# Altium footprint library Misc.PcbLib: 159 footprints (part 4 of 10)
Each footprint in its own frame and in the unit in brackets; x right, y up, seen from the top. Pads: shape width x height; smd on the part's side, far side on the other; paste and mask are expansions set on the pad; w line width, h text height; cw(c..) or ccw(c..) is an arc to the next point about the centre after c.
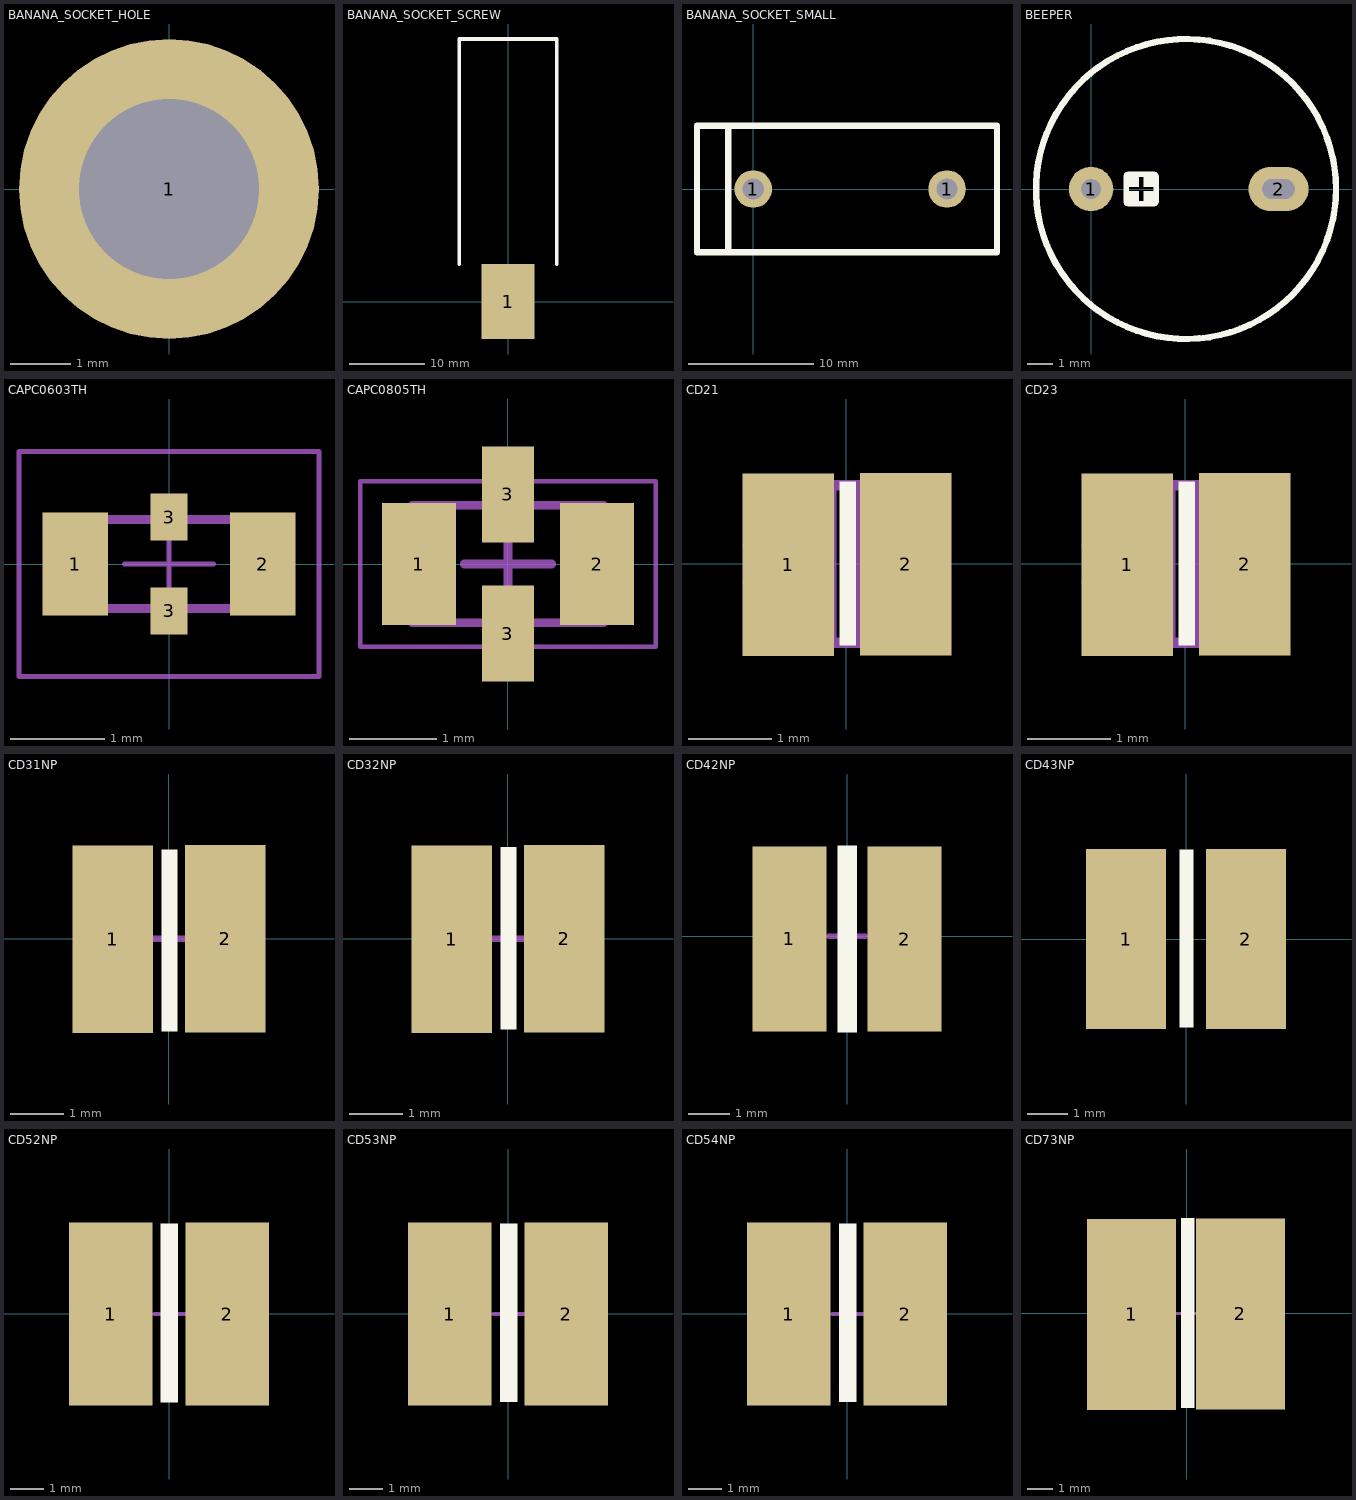
[diagram p3: the footprints below, top view; thin cyan lines are the x and y axes]

## BANANA_SOCKET_HOLE [mm]
pads (1):
  round 5 hole 3: 1(0,0)

## BANANA_SOCKET_SCREW [mm]
height 18
pads (1):
  rect 7x10 smd: 1(0,0)
Top Overlay:
  lines w0.5: -6.5,5 -6.5,35 6.5,35 6.5,5

## BANANA_SOCKET_SMALL [mm]
height 13
pads (2):
  round 3 hole 1.7: 1(0,0) 1(15.5,0)
Top Overlay:
  lines w0.508: -2,-5.05 -2,5.05 ; -4.5,-5.05 19.5,-5.05 19.5,5.05 -4.5,5.05 -4.5,-5.05
3D body: height 13, standoff 3, extent -4.5,-5 -2,5
3D body: height 13, standoff 0, extent -2,-5.05 19.5,5.05

## BEEPER [mm]
pads (2):
  round 1.778 hole 0.8: 1(0,0)
  oval 2.4x1.778 hole 0.8 slot 1.3 at 0 deg: 2(7.5,0)
Top Overlay:
  circle w0.254: c3.799,0 r6.001
  region: 1.5,0.7 1.46,0.7 1.387,0.67 1.33,0.613 1.3,0.54 1.3,0.5 1.3,-0.1 1.5,-0.1 1.5,0.1 1.9,0.1 1.9,0.5 2.1,0.5 2.1,0.1 2.5,0.1 2.5,-0.1 2.1,-0.1 2.1,-0.5 1.9,-0.5 1.9,-0.1 1.3,-0.1 1.3,-0.5 1.3,-0.54 1.33,-0.613 1.387,-0.67 1.46,-0.7 1.5,-0.7 2.5,-0.7 2.54,-0.7 2.613,-0.67 2.67,-0.613 2.7,-0.54 2.7,-0.5 2.7,0.5 2.7,0.54 2.67,0.613 2.613,0.67 2.54,0.7 2.5,0.7
3D body "User Library-WST-1203UX.STEP": height 9.65, standoff -4.5, extent -5.727,-6 9.727,6

## CAPC0603TH [mm] "Chip Capacitor, Body 1.6x0.8mm, Height 0.55mm, IPC Low Density"
height 0.55
pads (4):
  rect 0.7x1.1 smd: 1(-1,0) 2(1,0)
  rect 0.4x0.5 smd: 3(0,-0.5) 3(0,0.5)
Mechanical 13:
  lines w0.1: -0.875,-0.475 -0.875,0.475 0.875,0.475 0.875,-0.475 -0.875,-0.475
Mechanical 15:
  lines w0.05: -0.475,0 0.475,0 ; 0,-0.475 0,0.475 ; -1.6,-1.2 -1.6,1.2 1.6,1.2 1.6,-1.2 -1.6,-1.2
3D body: height 0.55, standoff 0, extent -0.525,-0.475 0.525,0.475
3D body: height 0.55, standoff 0, extent -0.875,-0.475 -0.525,0.475
3D body: height 0.55, standoff 0, extent 0.525,-0.475 0.875,0.475

## CAPC0805TH [mm] "Chip Capacitor, 2-Leads, Body 2.00x1.25mm, IPC Medium Density"
height 0.95
pads (4):
  rect 0.85x1.4 smd: 1(-1.025,0) 2(1.025,0)
  rect 0.6x1.1 smd: 3(0,-0.8) 3(0,0.8)
Assembly Top:
  lines w0.1: -1.1,-0.675 1.1,-0.675 1.1,0.675 -1.1,0.675 -1.1,-0.675
Courtyard Top:
  lines w0.05: -1.7,-0.95 1.7,-0.95 1.7,0.95 -1.7,0.95 -1.7,-0.95
  lines w0.1: -0.5,0 0.5,0 ; 0,-0.5 0,0.5
3D body: height 0.95, standoff 0, extent 0.9,-0.675 1.1,0.675
3D body: height 0.95, standoff 0, extent -1.1,-0.675 -0.9,0.675
3D body: height 0.95, standoff 0, extent -0.9,-0.675 0.9,0.675

## CD21 [mm] "CD23"
pads (2):
  rect 1.1x2.2 smd: 1(-0.702,-0.011) 2(0.716,-0.002)
Top Overlay:
  rectangle: -0.083,-0.985 0.118,0.997
Mechanical 2:
  lines w0.127: -0.181,-0.943 -0.181,0.935 ; 0.16,-0.947 0.16,0.94 ; -1.19,-0.22 ccw(c-0.01,-0.001) -0.744,-0.951 0.723,-0.951 ccw(c-0.01,-0.001) 1.169,-0.221 cw(c1.428,-0.001) 1.169,0.22 ccw(c-0.01,-0.001) 0.723,0.949 -0.744,0.949 ccw(c-0.01,-0.001) -1.19,0.219 cw(c-1.447,-0.001) -1.19,-0.22
3D body "CD21.STEP": height 1.6, standoff -0.05, extent -1.208,-1.024 1.259,0.976

## CD23 [mm] "CD23"
pads (2):
  rect 1.1x2.2 smd: 1(-0.702,-0.011) 2(0.716,-0.002)
Top Overlay:
  rectangle: -0.083,-0.985 0.118,0.997
Mechanical 2:
  lines w0.127: -0.181,-0.943 -0.181,0.935 ; 0.16,-0.947 0.16,0.94 ; -1.19,-0.22 ccw(c-1.447,-0.001) -1.19,0.219 cw(c-0.01,-0.001) -0.744,0.949 0.723,0.949 cw(c-0.01,-0.001) 1.169,0.22 ccw(c1.428,-0.001) 1.169,-0.221 cw(c-0.01,-0.001) 0.723,-0.951 -0.744,-0.951 cw(c-0.01,-0.001) -1.19,-0.22
3D body "CD23.STEP": height 2, standoff -0.05, extent -1.208,-1.024 1.259,0.976

## CD31NP [mm] "CD31"
pads (2):
  rect 1.5x3.5 smd: 1(-1.04,-0.012) 2(1.057,0)
Top Overlay:
  rectangle: -0.134,-1.73 0.165,1.66
Mechanical 2:
  lines w0.127: -1.485,0 1.496,0 ; 0.007,-1.4 0.007,1.4 ; -1.612,-0.32 ccw(c-1.954,0) -1.612,0.32 cw(c0.007,0) -0.867,1.4 -0.493,1.4 -0.493,-1.4 -0.867,-1.4 cw(c0.007,0) -1.612,-0.32 ; 0.507,-1.4 0.507,1.4 0.88,1.4 cw(c0.007,0) 1.625,0.323 ccw(c1.964,0) 1.625,-0.323 cw(c0.007,0) 0.88,-1.4 0.507,-1.4
3D body "CD31.STEP": height 1.6, standoff -0.05, extent -1.73,-1.472 1.723,1.528

## CD32NP [mm] "CD32"
pads (2):
  rect 1.5x3.5 smd: 1(-1.04,-0.012) 2(1.057,0)
Top Overlay:
  rectangle: -0.134,-1.695 0.165,1.709
Mechanical 2:
  lines w0.127: -1.485,0 1.496,0 ; 0.007,-1.4 0.007,1.4 ; -1.612,-0.32 ccw(c-1.954,0) -1.612,0.32 cw(c0.007,0) -0.867,1.4 -0.493,1.4 -0.493,-1.4 -0.867,-1.4 cw(c0.007,0) -1.612,-0.32 ; 0.507,-1.4 0.507,1.4 0.88,1.4 cw(c0.007,0) 1.625,0.323 ccw(c1.964,0) 1.625,-0.323 cw(c0.007,0) 0.88,-1.4 0.507,-1.4
3D body "CD32.STEP": height 2, standoff -0.05, extent -1.73,-1.472 1.723,1.528

## CD42NP [mm] "»òÕß¸ßµãCX43¹¦ÂÊµç¸Ð"
pads (2):
  rect 1.8x4.5 smd: 1(-1.4,-0.064) 2(1.4,-0.07)
Top Overlay:
  rectangle: -0.232,-2.34 0.237,2.204
Mechanical 2:
  lines w0.127: -0.45,0.001 0.45,0.001 ; 0,-1.461 0,1.587 ; -2.177,-0.317 ccw(c0,0.001) -1.018,-1.949 -0.65,-1.949 -0.65,1.951 -1.018,1.951 ccw(c0,0.001) -2.177,0.318 cw(c-2.45,0.001) -2.177,-0.317 ; 0.65,-1.949 0.65,1.951 1.019,1.951 cw(c0,0.001) 2.177,0.318 ccw(c2.45,0.001) 2.177,-0.317 cw(c0,0.001) 1.019,-1.949 0.65,-1.949
3D body "CD42.STEP": height 2, standoff -0.05, extent -2.23,-2.048 2.231,1.952

## CD43NP [mm] "¹¦ÂÊµç¸Ð"
pads (2):
  rect 2x4.5 smd: 1(-1.512,0) 2(1.488,0)
Top Overlay:
  rectangle: -0.169,-2.206 0.174,2.237
Mechanical 2:
  lines w0.05: 0.623,-2.115 0.623,2.115 ; 0.623,-2.115 1.101,-2.115 ; 0.623,-2.115 1.101,-2.115 ; 0.623,2.115 1.101,2.115 ; 0.623,2.115 1.101,2.115 ; 1.101,-2.115 ccw(c-0.012,0) 2.348,-0.375 ; 1.101,-2.115 ccw(c-0.012,0) 2.348,-0.375 ; 1.101,2.115 cw(c-0.012,0) 2.348,0.375 ; 2.348,-0.375 cw(c2.438,0) 2.348,0.375 ; 2.348,-0.375 cw(c2.438,0) 2.348,0.375 ; -2.372,-0.375 ccw(c-2.462,0) -2.372,0.375 cw(c-0.012,0) -1.125,2.115 -0.647,2.115 -0.647,-2.115 -1.125,-2.115 cw(c-0.012,0) -2.372,-0.375
3D body "User Library-CD43NP-22.STEP": height 3.5, standoff 0, extent -2.412,-2.141 2.388,2.159

## CD52NP [mm]
pads (2):
  rect 2.5x5.5 smd: 1(-1.752,-0.001) 2(1.748,-0.001)
Top Overlay:
  rectangle: -0.25,-2.65 0.274,2.716
Mechanical 2:
  lines w0.127: -0.442,-0.001 0.483,-0.001 ; -0.002,-0.257 -0.002,0.321 ; -2.831,-0.343 ccw(c-2.902,-0.001) -2.831,0.342 cw(c-0.002,-0.001) -1.275,2.549 -0.652,2.549 -0.652,-2.551 -1.275,-2.551 cw(c-0.002,-0.001) -2.831,-0.343 ; 0.648,-2.551 0.648,2.549 1.271,2.549 cw(c-0.002,-0.001) 2.827,0.342 ccw(c2.898,-0.001) 2.827,-0.343 cw(c-0.002,-0.001) 1.271,-2.551 0.648,-2.551
3D body "CD52.STEP": height 2.1, standoff -0.05, extent -2.889,-2.579 2.88,2.621

## CD53NP [mm]
pads (2):
  rect 2.5x5.5 smd: 1(-1.752,-0.001) 2(1.748,-0.001)
Top Overlay:
  rectangle: -0.248,-2.644 0.276,2.722
Mechanical 2:
  lines w0.127: -0.442,-0.001 0.483,-0.001 ; -0.002,-0.257 -0.002,0.321 ; -2.831,-0.343 ccw(c-0.002,-0.001) -1.275,-2.551 -0.652,-2.551 -0.652,2.549 -1.275,2.549 ccw(c-0.002,-0.001) -2.831,0.342 cw(c-2.902,-0.001) -2.831,-0.343 ; 0.648,-2.551 1.271,-2.551 ccw(c-0.002,-0.001) 2.827,-0.343 cw(c2.898,-0.001) 2.827,0.342 ccw(c-0.002,-0.001) 1.271,2.549 0.648,2.549 0.648,-2.551
3D body "CD53.STEP": height 3.2, standoff -0.05, extent -2.894,-2.563 2.875,2.637

## CD54NP [mm]
pads (2):
  rect 2.5x5.5 smd: 1(-1.752,-0.001) 2(1.748,-0.001)
Top Overlay:
  rectangle: -0.248,-2.644 0.276,2.722
Mechanical 2:
  lines w0.127: -0.442,-0.001 0.483,-0.001 ; -0.002,-0.257 -0.002,0.321 ; -2.831,-0.343 ccw(c-0.002,-0.001) -1.275,-2.551 -0.652,-2.551 -0.652,2.549 -1.275,2.549 ccw(c-0.002,-0.001) -2.831,0.342 cw(c-2.902,-0.001) -2.831,-0.343 ; 0.648,-2.551 1.271,-2.551 ccw(c-0.002,-0.001) 2.827,-0.343 cw(c2.898,-0.001) 2.827,0.342 ccw(c-0.002,-0.001) 1.271,2.549 0.648,2.549 0.648,-2.551
3D body "CD54.STEP": height 4.5, standoff -0.05, extent -2.895,-2.599 2.874,2.601

## CD73NP [mm]
pads (2):
  rect 3.5x7.5 smd: 1(-2.174,-0.051) 2(2.101,-0.028)
Top Overlay:
  rectangle: -0.232,-3.717 0.292,3.732
Mechanical 2:
  lines w0.127: -1.831,-0.017 1.584,-0.017 ; -0.016,-1.741 -0.016,1.427 ; -3.32,-0.82 ccw(c-3.916,-0.017) -3.32,0.786 cw(c-0.016,-0.017) -1.616,2.983 -0.766,2.983 -0.766,-3.017 -1.616,-3.017 cw(c-0.016,-0.017) -3.32,-0.82 ; 0.734,-3.017 0.734,2.983 1.584,2.983 cw(c-0.016,-0.017) 3.288,0.786 ccw(c3.884,-0.017) 3.288,-0.82 cw(c-0.016,-0.017) 1.584,-3.017 0.734,-3.017
3D body "CD73.STEP": height 3.5, standoff -0.05, extent -3.911,-3.567 3.825,3.433